# Altium footprint library ref-packages.PCBLIB: 1543 footprints (part 29 of 103)
Each footprint in its own frame and in the unit in brackets; x right, y up, seen from the top. Pads: shape width x height; smd on the part's side, far side on the other; paste and mask are expansions set on the pad; w line width, h text height; cw(c..) or ccw(c..) is an arc to the next point about the centre after c.
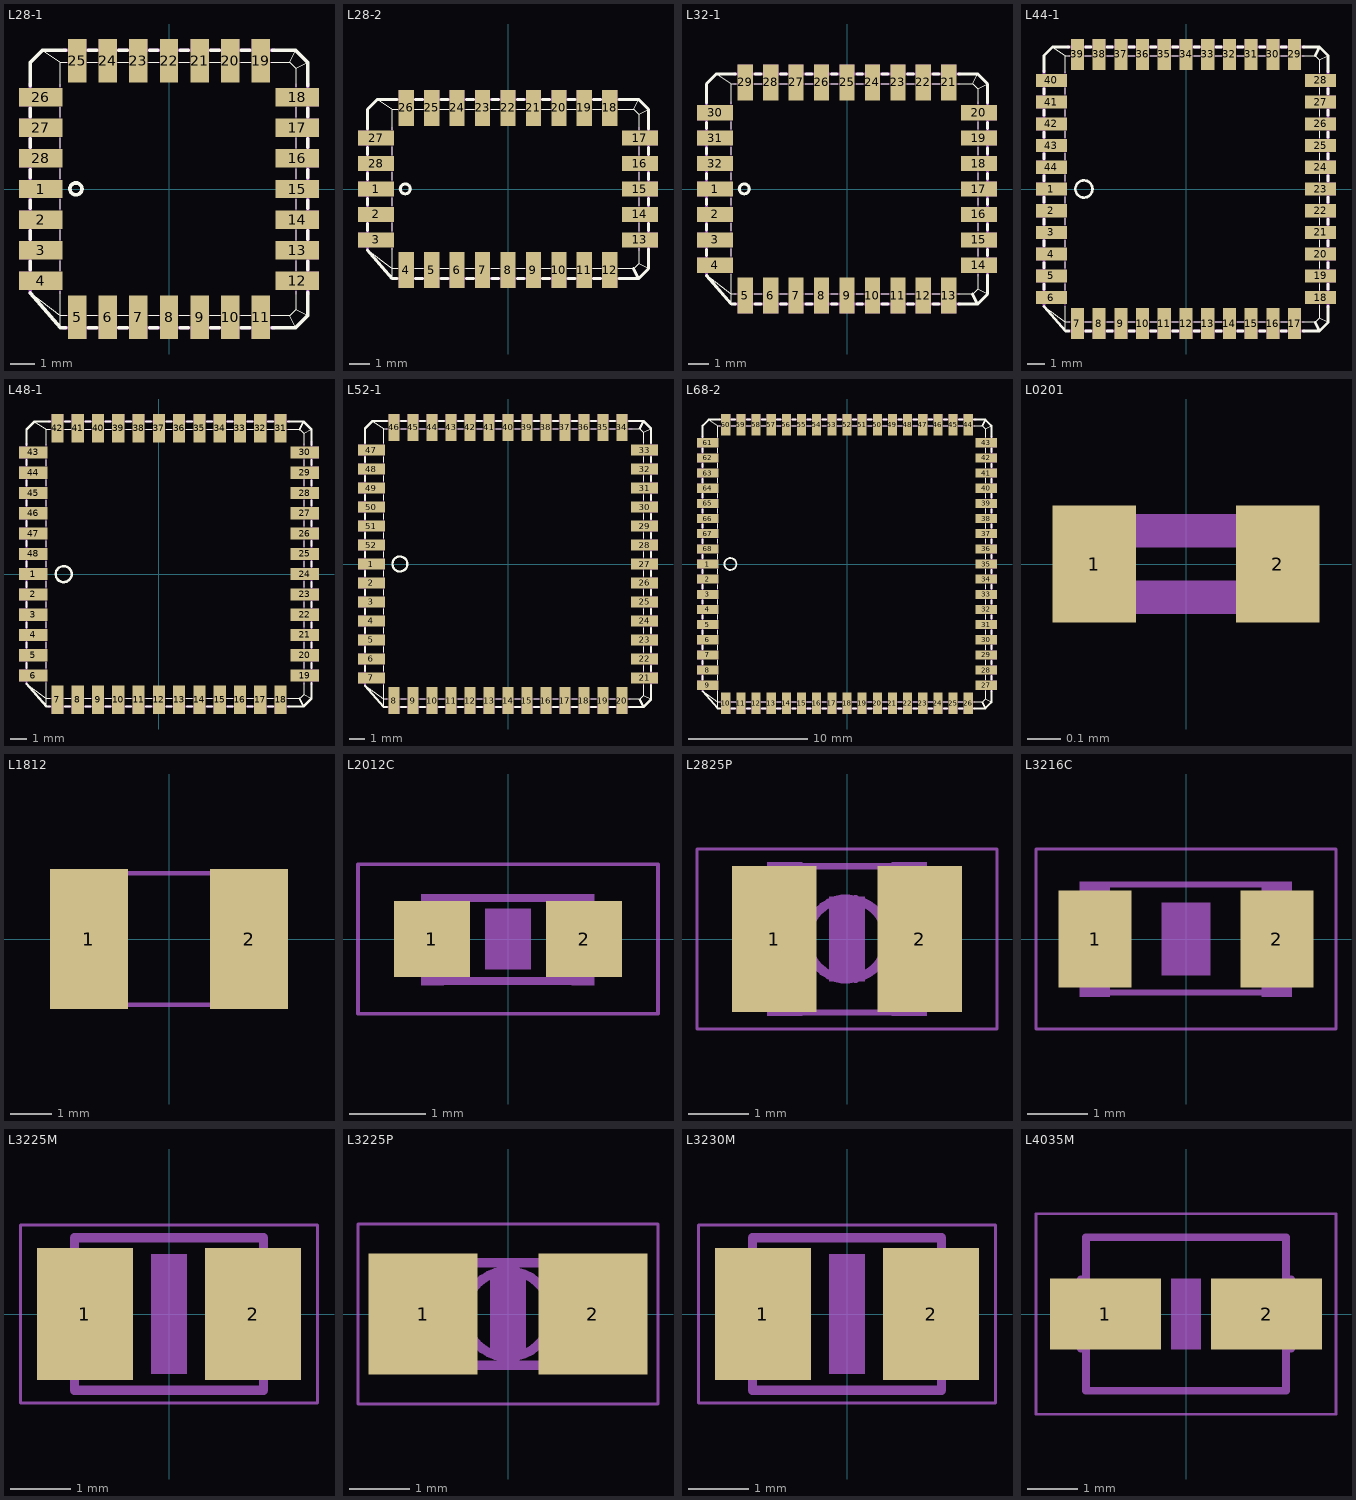
[diagram p28: the footprints below, top view; thin cyan lines are the x and y axes]

## L28-1 [mil]
pads (28):
  rect 70.87x29.92 smd: 1(-209.45,0) 2(-209.45,-50) 3(-209.45,-100) 4(-209.45,-150) 12(209.45,-150) 13(209.45,-100) 14(209.45,-50) 15(209.45,0) 16(209.45,50) 17(209.45,100) 18(209.45,150) 26(-209.45,150) 27(-209.45,100) 28(-209.45,50)
  rect 29.92x70.87 smd: 5(-150,-209.45) 6(-100,-209.45) 7(-50,-209.45) 8(0,-209.45) 9(50,-209.45) 10(100,-209.45) 11(150,-209.45) 19(150,209.45) 20(100,209.45) 21(50,209.45) 22(0,209.45) 23(-50,209.45) 24(-100,209.45) 25(-150,209.45)
Top Overlay:
  lines w2: -225.55,-170.32 -177.17,-206.69 ; -206.69,226.38 -177.17,206.69 ; -177.17,-226.38 -177.17,-206.69 ; -177.17,-166.73 -177.17,-206.69 ; -177.17,-133.27 -177.17,-116.73 ; -177.17,-83.27 -177.17,-66.73 ; -177.17,-33.27 -177.17,-16.73 ; -177.17,16.73 -177.17,33.27 ; -177.17,66.73 -177.17,83.27 ; -177.17,116.73 -177.17,133.27 ; -177.17,166.73 -177.17,206.69 ; -166.73,-206.69 -177.17,-206.69 ; -166.73,206.69 -177.17,206.69 ; -133.27,-206.69 -116.73,-206.69 ; -133.27,206.69 -116.73,206.69 ; -83.27,-206.69 -66.73,-206.69 ; -83.27,206.69 -66.73,206.69 ; -33.27,-206.69 -16.73,-206.69 ; -33.27,206.69 -16.73,206.69 ; 16.73,-206.69 33.27,-206.69 ; 16.73,206.69 33.27,206.69 ; 66.73,-206.69 83.27,-206.69 ; 66.73,206.69 83.27,206.69 ; 116.73,-206.69 133.27,-206.69 ; 116.73,206.69 133.27,206.69 ; 166.73,-206.69 196.85,-206.69 ; 166.73,206.69 196.85,206.69 ; 206.69,-226.38 196.85,-206.69 ; 206.69,-166.73 206.69,-196.85 ; 206.69,-133.27 206.69,-116.73 ; 206.69,-83.27 206.69,-66.73 ; 206.69,-33.27 206.69,-16.73 ; 206.69,16.73 206.69,33.27 ; 206.69,66.73 206.69,83.27 ; 206.69,116.73 206.69,133.27 ; 206.69,166.73 206.69,196.85 ; 206.69,226.38 196.85,206.69 ; 226.38,-206.69 206.69,-196.85 ; 226.38,206.69 206.69,196.85 ; 196.85,-206.69 206.69,-196.85 ; 196.85,206.69 206.69,196.85
  lines w6: -226.38,-169.88 -177.17,-226.38 -168.31,-226.38 ; -226.38,-131.69 -226.38,-118.31 ; -226.38,-81.69 -226.38,-68.31 ; -226.38,-31.69 -226.38,-18.31 ; -226.38,18.31 -226.38,31.69 ; -226.38,68.31 -226.38,81.69 ; -226.38,118.31 -226.38,131.69 ; -226.38,168.31 -226.38,206.69 -206.69,226.38 -168.31,226.38 ; -161.81,0.16 cw(c-152.31,0.26) -161.81,0.35 ; -142.13,0.04 ccw(c-151.97,0.1) -161.81,0.35 ; -142.13,0.28 cw(c-151.97,0.32) -161.81,0.35 ; -131.69,-226.38 -118.31,-226.38 ; -131.69,226.38 -118.31,226.38 ; -81.69,-226.38 -68.31,-226.38 ; -81.69,226.38 -68.31,226.38 ; -31.69,-226.38 -18.31,-226.38 ; -31.69,226.38 -18.31,226.38 ; 18.31,-226.38 31.69,-226.38 ; 18.31,226.38 31.69,226.38 ; 68.31,-226.38 81.69,-226.38 ; 68.31,226.38 81.69,226.38 ; 118.31,-226.38 131.69,-226.38 ; 118.31,226.38 131.69,226.38 ; 168.31,-226.38 206.69,-226.38 226.38,-206.69 226.38,-168.31 ; 168.31,226.38 206.69,226.38 226.38,206.69 226.38,168.31 ; 226.38,-131.69 226.38,-118.31 ; 226.38,-81.69 226.38,-68.31 ; 226.38,-31.69 226.38,-18.31 ; 226.38,18.31 226.38,31.69 ; 226.38,68.31 226.38,81.69 ; 226.38,118.31 226.38,131.69
Mechanical 16:
  rectangle: -164.96,226.38 -135.04,244.88
  rectangle: -114.96,226.38 -85.04,244.88
  rectangle: -64.96,226.38 -35.04,244.88
  rectangle: -14.96,226.38 14.96,244.88
  rectangle: 35.04,226.38 64.96,244.88
  rectangle: 85.04,226.38 114.96,244.88
  rectangle: 135.04,226.38 164.96,244.88
  rectangle: 226.38,135.04 244.88,164.96
  rectangle: 226.38,85.04 244.88,114.96
  rectangle: 226.38,35.04 244.88,64.96
  rectangle: 226.38,-14.96 244.88,14.96
  rectangle: 226.38,-64.96 244.88,-35.04
  rectangle: 226.38,-114.96 244.88,-85.04
  rectangle: 226.38,-164.96 244.88,-135.04
  rectangle: -164.96,-244.88 -135.04,-226.38
  rectangle: -114.96,-244.88 -85.04,-226.38
  rectangle: -64.96,-244.88 -35.04,-226.38
  rectangle: -14.96,-244.88 14.96,-226.38
  rectangle: 35.04,-244.88 64.96,-226.38
  rectangle: 85.04,-244.88 114.96,-226.38
  rectangle: 135.04,-244.88 164.96,-226.38
  rectangle: -244.88,135.04 -226.38,164.96
  rectangle: -244.88,85.04 -226.38,114.96
  rectangle: -244.88,35.04 -226.38,64.96
  rectangle: -244.88,-14.96 -226.38,14.96
  rectangle: -244.88,-64.96 -226.38,-35.04
  rectangle: -244.88,-114.96 -226.38,-85.04
  rectangle: -244.88,-164.96 -226.38,-135.04
  lines w2: -177.17,-171.06 -177.17,170.79 ; -174.25,-206.69 171.85,-206.69 ; -172.28,206.69 171.85,206.69 ; 206.69,-171.85 206.69,171.85
  lines w6: -226.38,-169.96 -226.38,171.69 ; -172.17,-226.38 171.69,-226.38 ; -171.69,226.38 171.69,226.38 ; 226.38,-171.69 226.38,171.69

## L28-2 [mil]
pads (28):
  rect 70.87x29.92 smd: 1(-259.45,0) 2(-259.45,-50) 3(-259.45,-100) 13(259.45,-100) 14(259.45,-50) 15(259.45,0) 16(259.45,50) 17(259.45,100) 27(-259.45,100) 28(-259.45,50)
  rect 29.92x70.87 smd: 4(-200,-159.45) 5(-150,-159.45) 6(-100,-159.45) 7(-50,-159.45) 8(0,-159.45) 9(50,-159.45) 10(100,-159.45) 11(150,-159.45) 12(200,-159.45) 18(200,159.45) 19(150,159.45) 20(100,159.45) 21(50,159.45) 22(0,159.45) 23(-50,159.45) 24(-100,159.45) 25(-150,159.45) 26(-200,159.45)
Top Overlay:
  lines w2: -276.18,-120.12 -227.17,-156.69 ; -256.69,176.38 -227.17,156.69 ; -227.17,-176.38 -227.17,-156.69 ; -227.17,-116.73 -227.17,-156.69 ; -227.17,-83.27 -227.17,-66.73 ; -227.17,-33.27 -227.17,-16.73 ; -227.17,16.73 -227.17,33.27 ; -227.17,66.73 -227.17,83.27 ; -227.17,116.73 -227.17,156.69 ; -216.73,-156.69 -227.17,-156.69 ; -216.73,156.69 -227.17,156.69 ; -183.27,-156.69 -166.73,-156.69 ; -183.27,156.69 -166.73,156.69 ; -133.27,-156.69 -116.73,-156.69 ; -133.27,156.69 -116.73,156.69 ; -83.27,-156.69 -66.73,-156.69 ; -83.27,156.69 -66.73,156.69 ; -33.27,-156.69 -16.73,-156.69 ; -33.27,156.69 -16.73,156.69 ; 16.73,-156.69 33.27,-156.69 ; 16.73,156.69 33.27,156.69 ; 66.73,-156.69 83.27,-156.69 ; 66.73,156.69 83.27,156.69 ; 116.73,-156.69 133.27,-156.69 ; 116.73,156.69 133.27,156.69 ; 166.73,-156.69 183.27,-156.69 ; 166.73,156.69 183.27,156.69 ; 216.73,-156.69 246.85,-156.69 256.69,-146.85 ; 216.73,156.69 246.85,156.69 ; 256.69,-116.73 256.69,-146.85 ; 256.69,-83.27 256.69,-66.73 ; 256.69,-33.27 256.69,-16.73 ; 256.69,16.73 256.69,33.27 ; 256.69,66.73 256.69,83.27 ; 256.69,116.73 256.69,146.85 ; 256.69,176.38 246.85,156.69 ; 276.38,-156.69 256.69,-146.85 ; 276.38,156.69 256.69,146.85 ; 246.85,156.69 256.69,146.85
  lines w6: -276.38,-119.88 -227.17,-176.38 -218.31,-176.38 ; -276.38,-81.69 -276.38,-68.31 ; -276.38,-31.69 -276.38,-18.31 ; -276.38,18.31 -276.38,31.69 ; -276.38,68.31 -276.38,81.69 ; -276.38,118.31 -276.38,156.69 -256.69,176.38 -218.31,176.38 ; -211.81,0.04 cw(c-201.97,0.04) -192.13,0.28 ; -211.81,0.35 ccw(c-201.97,0.32) -192.13,0.28 ; -192.13,0.04 ccw(c-202.13,0.16) -192.13,0.28 ; -181.69,-176.38 -168.31,-176.38 ; -181.69,176.38 -168.31,176.38 ; -131.69,-176.38 -118.31,-176.38 ; -131.69,176.38 -118.31,176.38 ; -81.69,-176.38 -68.31,-176.38 ; -81.69,176.38 -68.31,176.38 ; -31.69,-176.38 -18.31,-176.38 ; -31.69,176.38 -18.31,176.38 ; 18.31,-176.38 31.69,-176.38 ; 18.31,176.38 31.69,176.38 ; 68.31,-176.38 81.69,-176.38 ; 68.31,176.38 81.69,176.38 ; 118.31,-176.38 131.69,-176.38 ; 118.31,176.38 131.69,176.38 ; 168.31,-176.38 181.69,-176.38 ; 168.31,176.38 181.69,176.38 ; 218.31,-176.38 256.69,-176.38 ; 218.31,176.38 256.69,176.38 276.38,156.69 276.38,118.31 ; 246.85,-156.69 256.69,-176.38 ; 276.38,-118.31 276.38,-156.69 256.69,-176.38 ; 276.38,-81.69 276.38,-68.31 ; 276.38,-31.69 276.38,-18.31 ; 276.38,18.31 276.38,31.69 ; 276.38,68.31 276.38,81.69
Mechanical 16:
  rectangle: -214.96,176.38 -185.04,194.88
  rectangle: -164.96,176.38 -135.04,194.88
  rectangle: -114.96,176.38 -85.04,194.88
  rectangle: -64.96,176.38 -35.04,194.88
  rectangle: -14.96,176.38 14.96,194.88
  rectangle: 35.04,176.38 64.96,194.88
  rectangle: 85.04,176.38 114.96,194.88
  rectangle: 276.38,85.04 294.88,114.96
  rectangle: 276.38,35.04 294.88,64.96
  rectangle: 276.38,-14.96 294.88,14.96
  rectangle: 276.38,-64.96 294.88,-35.04
  rectangle: 276.38,-114.96 294.88,-85.04
  rectangle: -214.96,-194.88 -185.04,-176.38
  rectangle: -164.96,-194.88 -135.04,-176.38
  rectangle: -114.96,-194.88 -85.04,-176.38
  rectangle: -64.96,-194.88 -35.04,-176.38
  rectangle: -14.96,-194.88 14.96,-176.38
  rectangle: 35.04,-194.88 64.96,-176.38
  rectangle: 85.04,-194.88 114.96,-176.38
  rectangle: -294.88,85.04 -276.38,114.96
  rectangle: -294.88,35.04 -276.38,64.96
  rectangle: -294.88,-14.96 -276.38,14.96
  rectangle: -294.88,-64.96 -276.38,-35.04
  rectangle: -294.88,-114.96 -276.38,-85.04
  rectangle: 135.04,176.38 164.96,194.88
  rectangle: 185.04,176.38 214.96,194.88
  rectangle: 135.04,-194.88 164.96,-176.38
  rectangle: 185.04,-194.88 214.96,-176.38
  lines w2: -227.17,-119.21 -227.17,121.46 ; -222.68,-156.69 221.85,-156.69 ; -218.46,156.69 221.85,156.69 ; 256.69,-121.85 256.69,121.85
  lines w6: -276.38,-119.96 -276.38,121.69 ; -222.17,-176.38 221.69,-176.38 ; -221.69,176.38 221.69,176.38 ; 276.38,-121.69 276.38,121.69

## L32-1 [mil]
pads (32):
  rect 70.87x29.92 smd: 1(-259.45,0) 2(-259.45,-50) 3(-259.45,-100) 4(-259.45,-150) 14(259.45,-150) 15(259.45,-100) 16(259.45,-50) 17(259.45,0) 18(259.45,50) 19(259.45,100) 20(259.45,150) 30(-259.45,150) 31(-259.45,100) 32(-259.45,50)
  rect 29.92x70.87 smd: 5(-200,-209.45) 6(-150,-209.45) 7(-100,-209.45) 8(-50,-209.45) 9(0,-209.45) 10(50,-209.45) 11(100,-209.45) 12(150,-209.45) 13(200,-209.45) 21(200,209.45) 22(150,209.45) 23(100,209.45) 24(50,209.45) 25(0,209.45) 26(-50,209.45) 27(-100,209.45) 28(-150,209.45) 29(-200,209.45)
Top Overlay:
  lines w2: -275.94,-169.76 -227.17,-206.69 ; -256.69,226.38 -227.17,206.69 ; -227.17,-226.38 -227.17,-206.69 ; -227.17,-167.76 -227.17,-206.69 ; -227.17,-132.24 -227.17,-117.76 ; -227.17,-82.24 -227.17,-67.76 ; -227.17,-32.24 -227.17,-17.76 ; -227.17,17.76 -227.17,32.24 ; -227.17,67.76 -227.17,82.24 ; -227.17,117.76 -227.17,132.24 ; -227.17,167.76 -227.17,206.69 ; -217.76,-206.69 -227.17,-206.69 ; -217.76,206.69 -227.17,206.69 ; -182.24,-206.69 -167.76,-206.69 ; -182.24,206.69 -167.76,206.69 ; -132.24,-206.69 -117.76,-206.69 ; -132.24,206.69 -117.76,206.69 ; -82.24,-206.69 -67.76,-206.69 ; -82.24,206.69 -67.76,206.69 ; -32.24,-206.69 -17.76,-206.69 ; -32.24,206.69 -17.76,206.69 ; 17.76,-206.69 32.24,-206.69 ; 17.76,206.69 32.24,206.69 ; 67.76,-206.69 82.24,-206.69 ; 67.76,206.69 82.24,206.69 ; 117.76,-206.69 132.24,-206.69 ; 117.76,206.69 132.24,206.69 ; 167.76,-206.69 182.24,-206.69 ; 167.76,206.69 182.24,206.69 ; 217.76,-206.69 246.85,-206.69 256.69,-196.85 ; 217.76,206.69 246.85,206.69 ; 256.69,-167.76 256.69,-196.85 ; 256.69,-132.24 256.69,-117.76 ; 256.69,-82.24 256.69,-67.76 ; 256.69,-32.24 256.69,-17.76 ; 256.69,17.76 256.69,32.24 ; 256.69,67.76 256.69,82.24 ; 256.69,117.76 256.69,132.24 ; 256.69,167.76 256.69,196.85 ; 256.69,226.38 246.85,206.69 ; 276.38,-206.69 256.69,-196.85 ; 276.38,206.69 256.69,196.85 ; 246.85,206.69 256.69,196.85
  lines w6: -276.38,-169.72 -227.17,-226.38 -219.33,-226.38 ; -276.38,-130.67 -276.38,-119.33 ; -276.38,-80.67 -276.38,-69.33 ; -276.38,-30.67 -276.38,-19.33 ; -276.38,19.33 -276.38,30.67 ; -276.38,69.33 -276.38,80.67 ; -276.38,119.33 -276.38,130.67 ; -276.38,169.33 -276.38,206.69 -256.69,226.38 -219.33,226.38 ; -211.81,0.04 cw(c-201.97,0.04) -192.13,0.28 ; -211.81,0.35 ccw(c-201.97,0.32) -192.13,0.28 ; -192.13,0.04 ccw(c-202.13,0.16) -192.13,0.28 ; -180.67,-226.38 -169.33,-226.38 ; -180.67,226.38 -169.33,226.38 ; -130.67,-226.38 -119.33,-226.38 ; -130.67,226.38 -119.33,226.38 ; -80.67,-226.38 -69.33,-226.38 ; -80.67,226.38 -69.33,226.38 ; -30.67,-226.38 -19.33,-226.38 ; -30.67,226.38 -19.33,226.38 ; 19.33,-226.38 30.67,-226.38 ; 19.33,226.38 30.67,226.38 ; 69.33,-226.38 80.67,-226.38 ; 69.33,226.38 80.67,226.38 ; 119.33,-226.38 130.67,-226.38 ; 119.33,226.38 130.67,226.38 ; 169.33,-226.38 180.67,-226.38 ; 169.33,226.38 180.67,226.38 ; 219.33,-226.38 256.69,-226.38 ; 219.33,226.38 256.69,226.38 276.38,206.69 276.38,169.33 ; 246.85,-206.69 256.69,-226.38 ; 276.38,-169.33 276.38,-206.69 256.69,-226.38 ; 276.38,-130.67 276.38,-119.33 ; 276.38,-80.67 276.38,-69.33 ; 276.38,-30.67 276.38,-19.33 ; 276.38,19.33 276.38,30.67 ; 276.38,69.33 276.38,80.67 ; 276.38,119.33 276.38,130.67
Mechanical 16:
  rectangle: -114.96,226.38 -85.04,244.88
  rectangle: -64.96,226.38 -35.04,244.88
  rectangle: -14.96,226.38 14.96,244.88
  rectangle: 35.04,226.38 64.96,244.88
  rectangle: 85.04,226.38 114.96,244.88
  rectangle: 135.04,226.38 164.96,244.88
  rectangle: 185.04,226.38 214.96,244.88
  rectangle: 276.38,135.04 294.88,164.96
  rectangle: 276.38,85.04 294.88,114.96
  rectangle: 276.38,35.04 294.88,64.96
  rectangle: 276.38,-14.96 294.88,14.96
  rectangle: 276.38,-64.96 294.88,-35.04
  rectangle: 276.38,-114.96 294.88,-85.04
  rectangle: 276.38,-164.96 294.88,-135.04
  rectangle: -214.96,-244.88 -185.04,-226.38
  rectangle: -164.96,-244.88 -135.04,-226.38
  rectangle: -114.96,-244.88 -85.04,-226.38
  rectangle: -64.96,-244.88 -35.04,-226.38
  rectangle: -14.96,-244.88 14.96,-226.38
  rectangle: 35.04,-244.88 64.96,-226.38
  rectangle: 85.04,-244.88 114.96,-226.38
  rectangle: -294.88,135.04 -276.38,164.96
  rectangle: -294.88,85.04 -276.38,114.96
  rectangle: -294.88,35.04 -276.38,64.96
  rectangle: -294.88,-14.96 -276.38,14.96
  rectangle: -294.88,-64.96 -276.38,-35.04
  rectangle: -294.88,-114.96 -276.38,-85.04
  rectangle: -294.88,-164.96 -276.38,-135.04
  rectangle: -164.96,226.38 -135.04,244.88
  rectangle: -214.96,226.38 -185.04,244.88
  rectangle: 135.04,-244.88 164.96,-226.38
  rectangle: 185.04,-244.88 214.96,-226.38
  lines w2: -227.17,-167.13 -227.17,171.46 ; -223.07,206.69 221.85,206.69 ; -221.5,-206.69 221.85,-206.69 ; 256.69,-171.85 256.69,171.85
  lines w6: -276.38,-169.96 -276.38,171.69 ; -222.17,-226.38 221.69,-226.38 ; -221.69,226.38 221.69,226.38 ; 276.38,-171.69 276.38,171.69

## L44-1 [mil]
pads (44):
  rect 70.87x29.92 smd: 1(-309.45,0) 2(-309.45,-50) 3(-309.45,-100) 4(-309.45,-150) 5(-309.45,-200) 6(-309.45,-250) 18(309.45,-250) 19(309.45,-200) 20(309.45,-150) 21(309.45,-100) 22(309.45,-50) 23(309.45,0) 24(309.45,50) 25(309.45,100) 26(309.45,150) 27(309.45,200) 28(309.45,250) 40(-309.45,250) 41(-309.45,200) 42(-309.45,150) 43(-309.45,100) 44(-309.45,50)
  rect 29.92x70.87 smd: 7(-250,-309.45) 8(-200,-309.45) 9(-150,-309.45) 10(-100,-309.45) 11(-50,-309.45) 12(0,-309.45) 13(50,-309.45) 14(100,-309.45) 15(150,-309.45) 16(200,-309.45) 17(250,-309.45) 29(250,309.45) 30(200,309.45) 31(150,309.45) 32(100,309.45) 33(50,309.45) 34(0,309.45) 35(-50,309.45) 36(-100,309.45) 37(-150,309.45) 38(-200,309.45) 39(-250,309.45)
Top Overlay:
  circle w6: c-234.65,0 r19.69
  lines w2: -325.94,-270.55 -277.17,-306.69 ; -306.69,326.38 -277.17,306.69 ; -277.17,-326.38 -277.17,-306.69 ; -277.17,-269.33 -277.17,-306.69 ; -277.17,-232.24 -277.17,-217.76 ; -277.17,-182.24 -277.17,-167.76 ; -277.17,-132.24 -277.17,-117.76 ; -277.17,-82.24 -277.17,-67.76 ; -277.17,-32.24 -277.17,-17.76 ; -277.17,17.76 -277.17,32.24 ; -277.17,67.76 -277.17,82.24 ; -277.17,117.76 -277.17,132.24 ; -277.17,167.76 -277.17,182.24 ; -277.17,217.76 -277.17,232.24 ; -277.17,267.76 -277.17,306.69 ; -267.76,-306.69 -277.17,-306.69 ; -267.76,306.69 -277.17,306.69 ; -232.24,-306.69 -217.76,-306.69 ; -232.24,306.69 -217.76,306.69 ; -182.24,-306.69 -167.76,-306.69 ; -182.24,306.69 -167.76,306.69 ; -132.24,-306.69 -117.76,-306.69 ; -132.24,306.69 -117.76,306.69 ; -82.24,-306.69 -67.76,-306.69 ; -82.24,306.69 -67.76,306.69 ; -32.24,-306.69 -17.76,-306.69 ; -32.24,306.69 -17.76,306.69 ; 17.76,-306.69 32.24,-306.69 ; 17.76,306.69 32.24,306.69 ; 67.76,-306.69 82.24,-306.69 ; 67.76,306.69 82.24,306.69 ; 117.76,-306.69 132.24,-306.69 ; 117.76,306.69 132.24,306.69 ; 167.76,-306.69 182.24,-306.69 ; 167.76,306.69 182.24,306.69 ; 217.76,-306.69 232.24,-306.69 ; 217.76,306.69 232.24,306.69 ; 267.76,-306.69 296.85,-306.69 306.69,-296.85 ; 267.76,306.69 296.85,306.69 306.69,296.85 ; 306.69,-267.76 306.69,-296.85 ; 306.69,-232.24 306.69,-217.76 ; 306.69,-182.24 306.69,-167.76 ; 306.69,-132.24 306.69,-117.76 ; 306.69,-82.24 306.69,-67.76 ; 306.69,-32.24 306.69,-17.76 ; 306.69,17.76 306.69,32.24 ; 306.69,67.76 306.69,82.24 ; 306.69,117.76 306.69,132.24 ; 306.69,167.76 306.69,182.24 ; 306.69,217.76 306.69,232.24 ; 306.69,267.76 306.69,296.85 ; 326.38,-306.69 306.69,-296.85 ; 326.38,306.69 306.69,296.85
  lines w6: -326.38,-270.12 -277.17,-326.38 -269.33,-326.38 ; -326.38,-230.67 -326.38,-219.33 ; -326.38,-180.67 -326.38,-169.33 ; -326.38,-130.67 -326.38,-119.33 ; -326.38,-80.67 -326.38,-69.33 ; -326.38,-30.67 -326.38,-19.33 ; -326.38,19.33 -326.38,30.67 ; -326.38,69.33 -326.38,80.67 ; -326.38,119.33 -326.38,130.67 ; -326.38,169.33 -326.38,180.67 ; -326.38,219.33 -326.38,230.67 ; -326.38,269.33 -326.38,306.69 -306.69,326.38 -269.33,326.38 ; -230.67,-326.38 -219.33,-326.38 ; -230.67,326.38 -219.33,326.38 ; -180.67,-326.38 -169.33,-326.38 ; -180.67,326.38 -169.33,326.38 ; -130.67,-326.38 -119.33,-326.38 ; -130.67,326.38 -119.33,326.38 ; -80.67,-326.38 -69.33,-326.38 ; -80.67,326.38 -69.33,326.38 ; -30.67,-326.38 -19.33,-326.38 ; -30.67,326.38 -19.33,326.38 ; 19.33,-326.38 30.67,-326.38 ; 19.33,326.38 30.67,326.38 ; 69.33,-326.38 80.67,-326.38 ; 69.33,326.38 80.67,326.38 ; 119.33,-326.38 130.67,-326.38 ; 119.33,326.38 130.67,326.38 ; 169.33,-326.38 180.67,-326.38 ; 169.33,326.38 180.67,326.38 ; 219.33,-326.38 230.67,-326.38 ; 219.33,326.38 230.67,326.38 ; 269.33,-326.38 306.69,-326.38 ; 269.33,326.38 306.69,326.38 ; 296.85,-306.69 306.69,-326.38 ; 296.85,306.69 306.69,326.38 ; 326.38,-269.33 326.38,-306.69 306.69,-326.38 ; 326.38,-230.67 326.38,-219.33 ; 326.38,-180.67 326.38,-169.33 ; 326.38,-130.67 326.38,-119.33 ; 326.38,-80.67 326.38,-69.33 ; 326.38,-30.67 326.38,-19.33 ; 326.38,19.33 326.38,30.67 ; 326.38,69.33 326.38,80.67 ; 326.38,119.33 326.38,130.67 ; 326.38,169.33 326.38,180.67 ; 326.38,219.33 326.38,230.67 ; 326.38,269.33 326.38,306.69 306.69,326.38
Mechanical 16:
  rectangle: -114.96,326.38 -85.04,344.88
  rectangle: -64.96,326.38 -35.04,344.88
  rectangle: -14.96,326.38 14.96,344.88
  rectangle: 35.04,326.38 64.96,344.88
  rectangle: 85.04,326.38 114.96,344.88
  rectangle: 135.04,326.38 164.96,344.88
  rectangle: 185.04,326.38 214.96,344.88
  rectangle: 326.38,135.04 344.88,164.96
  rectangle: 326.38,85.04 344.88,114.96
  rectangle: 326.38,35.04 344.88,64.96
  rectangle: 326.38,-14.96 344.88,14.96
  rectangle: 326.38,-64.96 344.88,-35.04
  rectangle: 326.38,-114.96 344.88,-85.04
  rectangle: 326.38,-264.96 344.88,-235.04
  rectangle: -214.96,-344.88 -185.04,-326.38
  rectangle: -164.96,-344.88 -135.04,-326.38
  rectangle: -114.96,-344.88 -85.04,-326.38
  rectangle: -64.96,-344.88 -35.04,-326.38
  rectangle: -14.96,-344.88 14.96,-326.38
  rectangle: 35.04,-344.88 64.96,-326.38
  rectangle: 85.04,-344.88 114.96,-326.38
  rectangle: -344.88,135.04 -326.38,164.96
  rectangle: -344.88,85.04 -326.38,114.96
  rectangle: -344.88,35.04 -326.38,64.96
  rectangle: -344.88,-14.96 -326.38,14.96
  rectangle: -344.88,-64.96 -326.38,-35.04
  rectangle: -344.88,-114.96 -326.38,-85.04
  rectangle: -344.88,-264.96 -326.38,-235.04
  rectangle: -164.96,326.38 -135.04,344.88
  rectangle: -214.96,326.38 -185.04,344.88
  rectangle: 135.04,-344.88 164.96,-326.38
  rectangle: 185.04,-344.88 214.96,-326.38
  rectangle: -344.88,185.04 -326.38,214.96
  rectangle: -344.88,235.04 -326.38,264.96
  rectangle: -344.88,-164.96 -326.38,-135.04
  rectangle: -344.88,-214.96 -326.38,-185.04
  rectangle: 235.04,-344.88 264.96,-326.38
  rectangle: 326.38,-214.96 344.88,-185.04
  rectangle: 326.38,-164.96 344.88,-135.04
  rectangle: 326.38,185.04 344.88,214.96
  rectangle: 326.38,235.04 344.88,264.96
  rectangle: 235.04,326.38 264.96,344.88
  rectangle: -264.96,326.38 -235.04,344.88
  rectangle: -264.96,-344.88 -235.04,-326.38
  lines w2: -277.17,-269.29 -277.17,269.69 ; -270,-306.69 271.85,-306.69 ; -270,306.69 271.85,306.69 ; 306.69,-271.85 306.69,271.85
  lines w6: -326.38,-269.96 -326.38,271.69 ; -271.69,326.38 271.69,326.38 ; -267.17,-326.38 271.69,-326.38 ; 326.38,-271.69 326.38,271.69

## L48-1 [mil]
pads (48):
  rect 70.87x29.92 smd: 1(-309.45,0) 2(-309.45,-50) 3(-309.45,-100) 4(-309.45,-150) 5(-309.45,-200) 6(-309.45,-250) 19(359.45,-250) 20(359.45,-200) 21(359.45,-150) 22(359.45,-100) 23(359.45,-50) 24(359.45,0) 25(359.45,50) 26(359.45,100) 27(359.45,150) 28(359.45,200) 29(359.45,250) 30(359.45,300) 43(-309.45,300) 44(-309.45,250) 45(-309.45,200) 46(-309.45,150) 47(-309.45,100) 48(-309.45,50)
  rect 29.92x70.87 smd: 7(-250,-309.45) 8(-200,-309.45) 9(-150,-309.45) 10(-100,-309.45) 11(-50,-309.45) 12(0,-309.45) 13(50,-309.45) 14(100,-309.45) 15(150,-309.45) 16(200,-309.45) 17(250,-309.45) 18(300,-309.45) 31(300,359.45) 32(250,359.45) 33(200,359.45) 34(150,359.45) 35(100,359.45) 36(50,359.45) 37(0,359.45) 38(-50,359.45) 39(-100,359.45) 40(-150,359.45) 41(-200,359.45) 42(-250,359.45)
Top Overlay:
  circle w6: c-234.65,0 r19.69
  lines w2: -325.94,-270.94 -277.17,-306.69 ; -306.69,376.38 -277.17,356.69 ; -277.17,-326.38 -277.17,-306.69 ; -277.17,-267.76 -277.17,-306.69 ; -277.17,-232.24 -277.17,-217.76 ; -277.17,-182.24 -277.17,-167.76 ; -277.17,-132.24 -277.17,-117.76 ; -277.17,-82.24 -277.17,-67.76 ; -277.17,-32.24 -277.17,-17.76 ; -277.17,17.76 -277.17,32.24 ; -277.17,67.76 -277.17,82.24 ; -277.17,117.76 -277.17,132.24 ; -277.17,167.76 -277.17,182.24 ; -277.17,217.76 -277.17,232.24 ; -277.17,267.76 -277.17,282.24 ; -277.17,317.76 -277.17,356.69 ; -267.76,-306.69 -277.17,-306.69 ; -267.76,356.69 -277.17,356.69 ; -232.24,-306.69 -217.76,-306.69 ; -232.24,356.69 -217.76,356.69 ; -182.24,-306.69 -167.76,-306.69 ; -182.24,356.69 -167.76,356.69 ; -132.24,-306.69 -117.76,-306.69 ; -132.24,356.69 -117.76,356.69 ; -82.24,-306.69 -67.76,-306.69 ; -82.24,356.69 -67.76,356.69 ; -32.24,-306.69 -17.76,-306.69 ; -32.24,356.69 -17.76,356.69 ; 17.76,-306.69 32.24,-306.69 ; 17.76,356.69 32.24,356.69 ; 67.76,-306.69 82.24,-306.69 ; 67.76,356.69 82.24,356.69 ; 117.76,-306.69 132.24,-306.69 ; 117.76,356.69 132.24,356.69 ; 167.76,-306.69 182.24,-306.69 ; 167.76,356.69 182.24,356.69 ; 217.76,-306.69 232.24,-306.69 ; 217.76,356.69 232.24,356.69 ; 267.76,-306.69 282.24,-306.69 ; 267.76,356.69 282.24,356.69 ; 317.76,-306.69 346.85,-306.69 356.69,-296.85 ; 317.76,356.69 346.85,356.69 356.69,346.85 ; 356.69,-267.76 356.69,-296.85 ; 356.69,-232.24 356.69,-217.76 ; 356.69,-182.24 356.69,-167.76 ; 356.69,-131.26 356.69,-117.76 ; 356.69,-82.24 356.69,-67.76 ; 356.69,-32.24 356.69,-17.76 ; 356.69,17.76 356.69,32.24 ; 356.69,67.76 356.69,82.24 ; 356.69,117.76 356.69,132.24 ; 356.69,167.76 356.69,182.24 ; 356.69,217.76 356.69,232.24 ; 356.69,267.76 356.69,282.24 ; 356.69,317.76 356.69,346.85 ; 376.38,-306.69 356.69,-296.85 ; 376.38,356.69 356.69,346.85
  lines w6: -326.38,-270.12 -277.17,-326.38 -269.33,-326.38 ; -326.38,-230.67 -326.38,-219.33 ; -326.38,-180.67 -326.38,-169.33 ; -326.38,-130.67 -326.38,-119.33 ; -326.38,-80.67 -326.38,-69.33 ; -326.38,-30.67 -326.38,-19.33 ; -326.38,19.33 -326.38,30.67 ; -326.38,69.33 -326.38,80.67 ; -326.38,119.33 -326.38,130.67 ; -326.38,169.33 -326.38,180.67 ; -326.38,219.33 -326.38,230.67 ; -326.38,269.33 -326.38,280.67 ; -326.38,319.33 -326.38,356.69 -306.69,376.38 -269.33,376.38 ; -230.67,-326.38 -219.33,-326.38 ; -230.67,376.38 -219.33,376.38 ; -180.67,-326.38 -169.33,-326.38 ; -180.67,376.38 -169.33,376.38 ; -130.67,-326.38 -119.33,-326.38 ; -130.67,376.38 -119.33,376.38 ; -80.67,-326.38 -69.33,-326.38 ; -80.67,376.38 -69.33,376.38 ; -30.67,-326.38 -19.33,-326.38 ; -30.67,376.38 -19.33,376.38 ; 19.33,-326.38 30.67,-326.38 ; 19.33,376.38 30.67,376.38 ; 69.33,-326.38 80.67,-326.38 ; 69.33,376.38 80.67,376.38 ; 119.33,-326.38 130.67,-326.38 ; 119.33,376.38 130.67,376.38 ; 169.33,-326.38 180.67,-326.38 ; 169.33,376.38 180.67,376.38 ; 219.33,-326.38 230.67,-326.38 ; 219.33,376.38 230.67,376.38 ; 269.33,-326.38 280.67,-326.38 ; 269.33,376.38 280.67,376.38 ; 319.33,-326.38 356.69,-326.38 ; 319.33,376.38 356.69,376.38 ; 346.85,-306.69 356.69,-326.38 ; 346.85,356.69 356.69,376.38 ; 376.38,-269.33 376.38,-306.69 356.69,-326.38 ; 376.38,-230.67 376.38,-219.33 ; 376.38,-180.67 376.38,-169.33 ; 376.38,-130.67 376.38,-119.33 ; 376.38,-80.67 376.38,-69.33 ; 376.38,-30.67 376.38,-19.33 ; 376.38,19.33 376.38,30.67 ; 376.38,69.33 376.38,80.67 ; 376.38,119.33 376.38,130.67 ; 376.38,169.33 376.38,180.67 ; 376.38,219.33 376.38,230.67 ; 376.38,269.33 376.38,280.67 ; 376.38,319.33 376.38,356.69 356.69,376.38
Mechanical 16:
  rectangle: -114.96,376.38 -85.04,394.88
  rectangle: -64.96,376.38 -35.04,394.88
  rectangle: -14.96,376.38 14.96,394.88
  rectangle: 35.04,376.38 64.96,394.88
  rectangle: 85.04,376.38 114.96,394.88
  rectangle: 135.04,376.38 164.96,394.88
  rectangle: 185.04,376.38 214.96,394.88
  rectangle: 376.38,135.04 394.88,164.96
  rectangle: 376.38,85.04 394.88,114.96
  rectangle: 376.38,35.04 394.88,64.96
  rectangle: 376.38,-14.96 394.88,14.96
  rectangle: 376.38,-64.96 394.88,-35.04
  rectangle: 376.38,-114.96 394.88,-85.04
  rectangle: 376.38,-264.96 394.88,-235.04
  rectangle: -214.96,-344.88 -185.04,-326.38
  rectangle: -164.96,-344.88 -135.04,-326.38
  rectangle: -114.96,-344.88 -85.04,-326.38
  rectangle: -64.96,-344.88 -35.04,-326.38
  rectangle: -14.96,-344.88 14.96,-326.38
  rectangle: 35.04,-344.88 64.96,-326.38
  rectangle: 85.04,-344.88 114.96,-326.38
  rectangle: -344.88,135.04 -326.38,164.96
  rectangle: -344.88,85.04 -326.38,114.96
  rectangle: -344.88,35.04 -326.38,64.96
  rectangle: -344.88,-14.96 -326.38,14.96
  rectangle: -344.88,-64.96 -326.38,-35.04
  rectangle: -344.88,-114.96 -326.38,-85.04
  rectangle: -344.88,-264.96 -326.38,-235.04
  rectangle: -164.96,376.38 -135.04,394.88
  rectangle: -214.96,376.38 -185.04,394.88
  rectangle: 135.04,-344.88 164.96,-326.38
  rectangle: 185.04,-344.88 214.96,-326.38
  rectangle: -344.88,185.04 -326.38,214.96
  rectangle: -344.88,235.04 -326.38,264.96
  rectangle: -344.88,-164.96 -326.38,-135.04
  rectangle: -344.88,-214.96 -326.38,-185.04
  rectangle: 235.04,-344.88 264.96,-326.38
  rectangle: 376.38,-214.96 394.88,-185.04
  rectangle: 376.38,-164.96 394.88,-135.04
  rectangle: 376.38,185.04 394.88,214.96
  rectangle: 376.38,235.04 394.88,264.96
  rectangle: 235.04,376.38 264.96,394.88
  rectangle: -264.96,376.38 -235.04,394.88
  rectangle: -264.96,-344.88 -235.04,-326.38
  rectangle: 376.38,285.04 394.88,314.96
  rectangle: 285.04,376.38 314.96,394.88
  rectangle: -344.88,285.04 -326.38,314.96
  rectangle: 285.04,-344.88 314.96,-326.38
  lines w2: -277.17,-267.64 -277.17,320.16 ; -273.07,356.69 321.85,356.69 ; -271.89,-306.69 321.85,-306.69 ; 356.69,-271.85 356.69,321.85
  lines w6: -326.38,-269.96 -326.38,321.69 ; -272.17,-326.38 321.69,-326.38 ; -271.69,376.38 321.69,376.38 ; 376.38,-271.69 376.38,326.69

## L52-1 [mil]
pads (52):
  rect 70.87x29.92 smd: 1(-359.45,0) 2(-359.45,-50) 3(-359.45,-100) 4(-359.45,-150) 5(-359.45,-200) 6(-359.45,-250) 7(-359.45,-300) 21(359.45,-300) 22(359.45,-250) 23(359.45,-200) 24(359.45,-150) 25(359.45,-100) 26(359.45,-50) 27(359.45,0) 28(359.45,50) 29(359.45,100) 30(359.45,150) 31(359.45,200) 32(359.45,250) 33(359.45,300) 47(-359.45,300) 48(-359.45,250) 49(-359.45,200) 50(-359.45,150) 51(-359.45,100) 52(-359.45,50)
  rect 29.92x70.87 smd: 8(-300,-359.45) 9(-250,-359.45) 10(-200,-359.45) 11(-150,-359.45) 12(-100,-359.45) 13(-50,-359.45) 14(0,-359.45) 15(50,-359.45) 16(100,-359.45) 17(150,-359.45) 18(200,-359.45) 19(250,-359.45) 20(300,-359.45) 34(300,359.45) 35(250,359.45) 36(200,359.45) 37(150,359.45) 38(100,359.45) 39(50,359.45) 40(0,359.45) 41(-50,359.45) 42(-100,359.45) 43(-150,359.45) 44(-200,359.45) 45(-250,359.45) 46(-300,359.45)
Top Overlay:
  circle w6: c-284.65,0 r19.69
  lines w2: -375.79,-320.55 -327.17,-356.69 ; -356.69,376.38 -327.17,356.69 ; -327.17,-376.38 -327.17,-356.69 ; -327.17,-317.76 -327.17,-356.69 ; -327.17,-282.24 -327.17,-267.76 ; -327.17,-232.24 -327.17,-217.76 ; -327.17,-182.24 -327.17,-167.76 ; -327.17,-132.24 -327.17,-117.76 ; -327.17,-82.24 -327.17,-67.76 ; -327.17,-32.24 -327.17,-17.76 ; -327.17,17.76 -327.17,32.24 ; -327.17,67.76 -327.17,82.24 ; -327.17,117.76 -327.17,132.24 ; -327.17,167.76 -327.17,182.24 ; -327.17,217.76 -327.17,232.24 ; -327.17,267.76 -327.17,282.24 ; -327.17,317.76 -327.17,356.69 ; -317.76,-356.69 -327.17,-356.69 ; -317.76,356.69 -327.17,356.69 ; -282.24,-356.69 -267.76,-356.69 ; -282.24,356.69 -267.76,356.69 ; -232.24,-356.69 -217.76,-356.69 ; -232.24,356.69 -217.76,356.69 ; -182.24,-356.69 -167.76,-356.69 ; -182.24,356.69 -167.76,356.69 ; -132.24,-356.69 -117.76,-356.69 ; -132.24,356.69 -117.76,356.69 ; -82.24,-356.69 -67.76,-356.69 ; -82.24,356.69 -67.76,356.69 ; -32.24,-356.69 -17.76,-356.69 ; -32.24,356.69 -17.76,356.69 ; 17.76,-356.69 32.24,-356.69 ; 17.76,356.69 32.24,356.69 ; 67.76,-356.69 82.24,-356.69 ; 67.76,356.69 82.24,356.69 ; 117.76,-356.69 132.24,-356.69 ; 117.76,356.69 132.24,356.69 ; 167.76,-356.69 182.24,-356.69 ; 167.76,356.69 182.24,356.69 ; 217.76,-356.69 232.24,-356.69 ; 217.76,356.69 232.24,356.69 ; 267.76,-356.69 282.24,-356.69 ; 267.76,356.69 282.24,356.69 ; 317.76,-356.69 346.85,-356.69 356.69,-346.85 ; 317.76,356.69 346.85,356.69 356.69,346.85 ; 356.69,-317.76 356.69,-346.85 ; 356.69,-282.24 356.69,-267.76 ; 356.69,-232.24 356.69,-217.76 ; 356.69,-182.24 356.69,-167.76 ; 356.69,-132.24 356.69,-117.76 ; 356.69,-82.24 356.69,-67.76 ; 356.69,-32.24 356.69,-17.76 ; 356.69,17.76 356.69,32.24 ; 356.69,67.76 356.69,82.24 ; 356.69,117.76 356.69,132.24 ; 356.69,167.76 356.69,182.24 ; 356.69,217.76 356.69,232.24 ; 356.69,267.76 356.69,282.24 ; 356.69,317.76 356.69,346.85 ; 376.38,-356.69 356.69,-346.85 ; 376.38,356.69 356.69,346.85
  lines w6: -376.38,-320.12 -327.17,-376.38 -319.33,-376.38 ; -376.38,-280.67 -376.38,-269.33 ; -376.38,-230.67 -376.38,-219.33 ; -376.38,-180.67 -376.38,-169.33 ; -376.38,-130.67 -376.38,-119.33 ; -376.38,-80.67 -376.38,-69.33 ; -376.38,-30.67 -376.38,-19.33 ; -376.38,19.33 -376.38,30.67 ; -376.38,69.33 -376.38,80.67 ; -376.38,119.33 -376.38,130.67 ; -376.38,169.33 -376.38,180.67 ; -376.38,219.33 -376.38,230.67 ; -376.38,269.33 -376.38,280.67 ; -376.38,319.33 -376.38,356.69 -356.69,376.38 -319.33,376.38 ; -280.67,-376.38 -269.33,-376.38 ; -280.67,376.38 -269.33,376.38 ; -230.67,-376.38 -219.33,-376.38 ; -230.67,376.38 -219.33,376.38 ; -180.67,-376.38 -169.33,-376.38 ; -180.67,376.38 -169.33,376.38 ; -130.67,-376.38 -119.33,-376.38 ; -130.67,376.38 -119.33,376.38 ; -80.67,-376.38 -69.33,-376.38 ; -80.67,376.38 -69.33,376.38 ; -30.67,-376.38 -19.33,-376.38 ; -30.67,376.38 -19.33,376.38 ; 19.33,-376.38 30.67,-376.38 ; 19.33,376.38 30.67,376.38 ; 69.33,-376.38 80.67,-376.38 ; 69.33,376.38 80.67,376.38 ; 119.33,-376.38 130.67,-376.38 ; 119.33,376.38 130.67,376.38 ; 169.33,-376.38 180.67,-376.38 ; 169.33,376.38 180.67,376.38 ; 219.33,-376.38 230.67,-376.38 ; 219.33,376.38 230.67,376.38 ; 269.33,-376.38 280.67,-376.38 ; 269.33,376.38 280.67,376.38 ; 319.33,-376.38 356.69,-376.38 ; 319.33,376.38 356.69,376.38 ; 346.85,-356.69 356.69,-376.38 ; 346.85,356.69 356.69,376.38 ; 376.38,-319.33 376.38,-356.69 356.69,-376.38 ; 376.38,-280.67 376.38,-269.33 ; 376.38,-230.67 376.38,-219.33 ; 376.38,-180.67 376.38,-169.33 ; 376.38,-130.67 376.38,-119.33 ; 376.38,-80.67 376.38,-69.33 ; 376.38,-30.67 376.38,-19.33 ; 376.38,19.33 376.38,30.67 ; 376.38,69.33 376.38,80.67 ; 376.38,119.33 376.38,130.67 ; 376.38,169.33 376.38,180.67 ; 376.38,219.33 376.38,230.67 ; 376.38,269.33 376.38,280.67 ; 376.38,319.33 376.38,356.69 356.69,376.38
Mechanical 16:
  rectangle: -164.96,376.38 -135.04,394.88
  rectangle: -114.96,376.38 -85.04,394.88
  rectangle: -64.96,376.38 -35.04,394.88
  rectangle: -14.96,376.38 14.96,394.88
  rectangle: 35.04,376.38 64.96,394.88
  rectangle: 85.04,376.38 114.96,394.88
  rectangle: 135.04,376.38 164.96,394.88
  rectangle: 376.38,85.04 394.88,114.96
  rectangle: 376.38,35.04 394.88,64.96
  rectangle: 376.38,-14.96 394.88,14.96
  rectangle: 376.38,-64.96 394.88,-35.04
  rectangle: 376.38,-114.96 394.88,-85.04
  rectangle: 376.38,-164.96 394.88,-135.04
  rectangle: 376.38,-314.96 394.88,-285.04
  rectangle: -264.96,-394.88 -235.04,-376.38
  rectangle: -214.96,-394.88 -185.04,-376.38
  rectangle: -164.96,-394.88 -135.04,-376.38
  rectangle: -114.96,-394.88 -85.04,-376.38
  rectangle: -64.96,-394.88 -35.04,-376.38
  rectangle: -14.96,-394.88 14.96,-376.38
  rectangle: 35.04,-394.88 64.96,-376.38
  rectangle: -394.88,85.04 -376.38,114.96
  rectangle: -394.88,35.04 -376.38,64.96
  rectangle: -394.88,-14.96 -376.38,14.96
  rectangle: -394.88,-64.96 -376.38,-35.04
  rectangle: -394.88,-114.96 -376.38,-85.04
  rectangle: -394.88,-164.96 -376.38,-135.04
  rectangle: -394.88,-314.96 -376.38,-285.04
  rectangle: -214.96,376.38 -185.04,394.88
  rectangle: -264.96,376.38 -235.04,394.88
  rectangle: 85.04,-394.88 114.96,-376.38
  rectangle: 135.04,-394.88 164.96,-376.38
  rectangle: -394.88,135.04 -376.38,164.96
  rectangle: -394.88,185.04 -376.38,214.96
  rectangle: -394.88,-214.96 -376.38,-185.04
  rectangle: -394.88,-264.96 -376.38,-235.04
  rectangle: 185.04,-394.88 214.96,-376.38
  rectangle: 376.38,-264.96 394.88,-235.04
  rectangle: 376.38,-214.96 394.88,-185.04
  rectangle: 376.38,135.04 394.88,164.96
  rectangle: 376.38,185.04 394.88,214.96
  rectangle: 185.04,376.38 214.96,394.88
  rectangle: -314.96,376.38 -285.04,394.88
  rectangle: -314.96,-394.88 -285.04,-376.38
  rectangle: 235.04,376.38 264.96,394.88
  rectangle: 235.04,-394.88 264.96,-376.38
  rectangle: 285.04,-394.88 314.96,-376.38
  rectangle: 285.04,376.38 314.96,394.88
  rectangle: -394.88,235.04 -376.38,264.96
  rectangle: -394.88,285.04 -376.38,314.96
  rectangle: 376.38,235.04 394.88,264.96
  rectangle: 376.38,285.04 394.88,314.96
  lines w2: -327.17,-320.67 -327.17,322.24 ; -322.28,-356.69 321.85,-356.69 ; -320.04,356.69 326.85,356.69 ; 356.69,-321.85 356.69,326.85
  lines w6: -376.38,-319.96 -376.38,321.69 ; -322.17,-376.38 321.69,-376.38 ; -321.69,376.38 326.69,376.38 ; 376.38,-321.69 376.38,326.69

## L68-2 [mil]
pads (68):
  rect 70.87x29.92 smd: 1(-459.45,0) 2(-459.45,-50) 3(-459.45,-100) 4(-459.45,-150) 5(-459.45,-200) 6(-459.45,-250) 7(-459.45,-300) 8(-459.45,-350) 9(-459.45,-400) 27(459.45,-400) 28(459.45,-350) 29(459.45,-300) 30(459.45,-250) 31(459.45,-200) 32(459.45,-150) 33(459.45,-100) 34(459.45,-50) 35(459.45,0) 36(459.45,50) 37(459.45,100) 38(459.45,150) 39(459.45,200) 40(459.45,250) 41(459.45,300) 42(459.45,350) 43(459.45,400) 61(-459.45,400) 62(-459.45,350) 63(-459.45,300) 64(-459.45,250) 65(-459.45,200) 66(-459.45,150) 67(-459.45,100) 68(-459.45,50)
  rect 29.92x70.87 smd: 10(-400,-459.45) 11(-350,-459.45) 12(-300,-459.45) 13(-250,-459.45) 14(-200,-459.45) 15(-150,-459.45) 16(-100,-459.45) 17(-50,-459.45) 18(0,-459.45) 19(50,-459.45) 20(100,-459.45) 21(150,-459.45) 22(200,-459.45) 23(250,-459.45) 24(300,-459.45) 25(350,-459.45) 26(400,-459.45) 44(400,459.45) 45(350,459.45) 46(300,459.45) 47(250,459.45) 48(200,459.45) 49(150,459.45) 50(100,459.45) 51(50,459.45) 52(0,459.45) 53(-50,459.45) 54(-100,459.45) 55(-150,459.45) 56(-200,459.45) 57(-250,459.45) 58(-300,459.45) 59(-350,459.45) 60(-400,459.45)
Top Overlay:
  drawing of 157 lines, arcs and shapes, not listed
Mechanical 16:
  rectangle: -114.96,476.38 -85.04,494.88
  rectangle: -64.96,476.38 -35.04,494.88
  rectangle: -14.96,476.38 14.96,494.88
  rectangle: 35.04,476.38 64.96,494.88
  rectangle: 85.04,476.38 114.96,494.88
  rectangle: 135.04,476.38 164.96,494.88
  rectangle: 185.04,476.38 214.96,494.88
  rectangle: 476.38,135.04 494.88,164.96
  rectangle: 476.38,85.04 494.88,114.96
  rectangle: 476.38,35.04 494.88,64.96
  rectangle: 476.38,-14.96 494.88,14.96
  rectangle: 476.38,-64.96 494.88,-35.04
  rectangle: 476.38,-114.96 494.88,-85.04
  rectangle: 476.38,-414.96 494.88,-385.04
  rectangle: -214.96,-494.88 -185.04,-476.38
  rectangle: -164.96,-494.88 -135.04,-476.38
  rectangle: -114.96,-494.88 -85.04,-476.38
  rectangle: -64.96,-494.88 -35.04,-476.38
  rectangle: -14.96,-494.88 14.96,-476.38
  rectangle: 35.04,-494.88 64.96,-476.38
  rectangle: 85.04,-494.88 114.96,-476.38
  rectangle: -494.88,135.04 -476.38,164.96
  rectangle: -494.88,85.04 -476.38,114.96
  rectangle: -494.88,35.04 -476.38,64.96
  rectangle: -494.88,-14.96 -476.38,14.96
  rectangle: -494.88,-64.96 -476.38,-35.04
  rectangle: -494.88,-114.96 -476.38,-85.04
  rectangle: -494.88,-414.96 -476.38,-385.04
  rectangle: -164.96,476.38 -135.04,494.88
  rectangle: -214.96,476.38 -185.04,494.88
  rectangle: 135.04,-494.88 164.96,-476.38
  rectangle: 185.04,-494.88 214.96,-476.38
  rectangle: -494.88,185.04 -476.38,214.96
  rectangle: -494.88,235.04 -476.38,264.96
  rectangle: -494.88,-164.96 -476.38,-135.04
  rectangle: -494.88,-214.96 -476.38,-185.04
  rectangle: 235.04,-494.88 264.96,-476.38
  rectangle: 476.38,-214.96 494.88,-185.04
  rectangle: 476.38,-164.96 494.88,-135.04
  rectangle: 476.38,185.04 494.88,214.96
  rectangle: 476.38,235.04 494.88,264.96
  rectangle: 235.04,476.38 264.96,494.88
  rectangle: -264.96,476.38 -235.04,494.88
  rectangle: -264.96,-494.88 -235.04,-476.38
  rectangle: 476.38,-264.96 494.88,-235.04
  rectangle: 476.38,-314.96 494.88,-285.04
  rectangle: 476.38,-364.96 494.88,-335.04
  rectangle: 285.04,-494.88 314.96,-476.38
  rectangle: 335.04,-494.88 364.96,-476.38
  rectangle: 385.04,-494.88 414.96,-476.38
  rectangle: -314.96,-494.88 -285.04,-476.38
  rectangle: -364.96,-494.88 -335.04,-476.38
  rectangle: -414.96,-494.88 -385.04,-476.38
  rectangle: -494.88,-264.96 -476.38,-235.04
  rectangle: -494.88,-314.96 -476.38,-285.04
  rectangle: -494.88,-364.96 -476.38,-335.04
  rectangle: -314.96,476.38 -285.04,494.88
  rectangle: -364.96,476.38 -335.04,494.88
  rectangle: -414.96,476.38 -385.04,494.88
  rectangle: -494.88,285.04 -476.38,314.96
  rectangle: -494.88,335.04 -476.38,364.96
  rectangle: -494.88,385.04 -476.38,414.96
  rectangle: 285.04,476.38 314.96,494.88
  rectangle: 335.04,476.38 364.96,494.88
  rectangle: 385.04,476.38 414.96,494.88
  rectangle: 476.38,285.04 494.88,314.96
  rectangle: 476.38,335.04 494.88,364.96
  rectangle: 476.38,385.04 494.88,414.96
  lines w2: -427.17,-421.85 -427.17,419.09 ; -422.4,456.69 421.85,456.69 ; -420.43,-456.69 421.85,-456.69 ; 456.69,-421.85 456.69,421.85
  lines w6: -476.38,-419.96 -476.38,421.69 ; -421.69,476.38 426.69,476.38 ; -417.17,-476.38 421.69,-476.38 ; 476.38,-421.69 476.38,421.69

## L0201 [mm]
pads (2):
  rect 0.25x0.35 smd: 1(-0.275,0) 2(0.275,0)
Mechanical 16:
  rectangle: -0.3,-0.15 -0.15,0.15
  rectangle: 0.15,-0.15 0.3,0.15
  rectangle: -0.15,0.05 0.15,0.15
  rectangle: -0.15,-0.15 0.15,-0.05

## L1812 [mil]
pads (2):
  rect 74.8x133.86 smd: 1(-76.77,0) 2(76.77,0)
Mechanical 16:
  rectangle: -94,-65 -56.6,64.92
  rectangle: 57,-65 94.4,64.92
  lines w4: -58,63 58,63 ; -57,-63 58,-63

## L2012C [mm]
pads (2):
  rect 1x1 smd: 1(-1,0) 2(1,0)
Mechanical 6:
  rectangle: -0.3,-0.4 0.3,0.4
Mechanical 16:
  rectangle: -1.143,-0.61 -0.843,0.59
  rectangle: 0.838,-0.61 1.138,0.59
  lines w0.102: -0.864,-0.553 0.864,-0.553 ; -0.864,0.54 0.864,0.54
Mechanical 27:
  lines w0.051: -1.973,-0.983 1.973,-0.983 1.973,0.983 -1.973,0.983 -1.973,-0.983

## L2825P [mil]
pads (2):
  rect 55.12x94.49 smd: 1(-47.24,0) 2(47.24,0)
Mechanical 6:
  rectangle: -11.81,-27.56 11.81,27.56
Mechanical 16:
  circle w6: c0,0 r26
  rectangle: 29,-50 52,50
  rectangle: -52,-50 -29,50
  lines w4: -52.76,-37.99 -52.76,37.99 ; -30,-47.76 30,-47.76 ; -30,47.24 30,47.24 ; 52.76,-37.99 52.76,37.99
Mechanical 27:
  lines w2: -97.36,-58.39 97.36,-58.39 97.36,58.39 -97.36,58.39 -97.36,-58.39

## L3216C [mil]
pads (2):
  rect 47.24x62.99 smd: 1(-59.06,0) 2(59.06,0)
Mechanical 6:
  rectangle: -15.75,-23.62 15.75,23.62
Mechanical 16:
  rectangle: -69,-37.5 -49.31,37.3
  rectangle: 49,-37.5 68.69,37.3
  lines w4: -50,-34.76 50,-34.76 ; -50,35.28 50,35.28
Mechanical 27:
  lines w2: -97.36,-58.39 97.36,-58.39 97.36,58.39 -97.36,58.39 -97.36,-58.39

## L3225M [mil]
pads (2):
  rect 62.99x86.61 smd: 1(-55.12,0) 2(55.12,0)
Mechanical 6:
  rectangle: -11.81,-39.37 11.81,39.37
Mechanical 16:
  lines w6: -65,-37.01 -65,37.01 ; 65,-37.01 65,37.01 ; -62.01,-50 62.01,-50 62.01,50 -62.01,50 -62.01,-50
Mechanical 27:
  lines w2: -97.36,-58.39 97.36,-58.39 97.36,58.39 -97.36,58.39 -97.36,-58.39

## L3225P [mm]
pads (2):
  rect 1.8x2 smd: 1(-1.4,0) 2(1.4,0)
Mechanical 6:
  rectangle: -0.3,-0.7 0.3,0.7
Mechanical 16:
  circle w0.152: c0,0 r0.712
  lines w0.152: -1.676,-0.845 1.676,-0.845 ; -1.676,-0.838 -1.676,0.838 ; -1.676,0.845 1.676,0.845 ; -1.168,-0.838 -1.168,0.838 ; 1.168,-0.838 1.168,0.838 ; 1.676,-0.838 1.676,0.838
Mechanical 27:
  lines w0.051: -2.473,-1.483 2.473,-1.483 2.473,1.483 -2.473,1.483 -2.473,-1.483

## L3230M [mil]
pads (2):
  rect 62.99x86.61 smd: 1(-55.12,0) 2(55.12,0)
Mechanical 6:
  rectangle: -11.81,-39.37 11.81,39.37
Mechanical 16:
  lines w6: -65,-37.01 -65,37.01 ; 65,-37.01 65,37.01 ; -62.01,-50 62.01,-50 62.01,50 -62.01,50 -62.01,-50
Mechanical 27:
  lines w2: -97.36,-58.39 97.36,-58.39 97.36,58.39 -97.36,58.39 -97.36,-58.39

## L4035M [mil]
pads (2):
  rect 86.61x55.12 smd: 1(-62.99,0) 2(62.99,0)
Mechanical 6:
  rectangle: -11.81,-27.56 11.81,27.56
Mechanical 16:
  lines w6: -82.01,-27.01 -82.01,27.01 ; 82.01,-27.01 82.01,27.01 ; -77.99,-60 -77.99,60 77.99,60 77.99,-60 -77.99,-60
Mechanical 27:
  lines w2: -117.05,-78.07 117.05,-78.07 117.05,78.07 -117.05,78.07 -117.05,-78.07